# Altium footprint library Power_Lib_Altium.PcbLib: 383 footprints (part 22 of 24)
Each footprint in its own frame and in the unit in brackets; x right, y up, seen from the top. Pads: shape width x height; smd on the part's side, far side on the other; paste and mask are expansions set on the pad; w line width, h text height; cw(c..) or ccw(c..) is an arc to the next point about the centre after c.
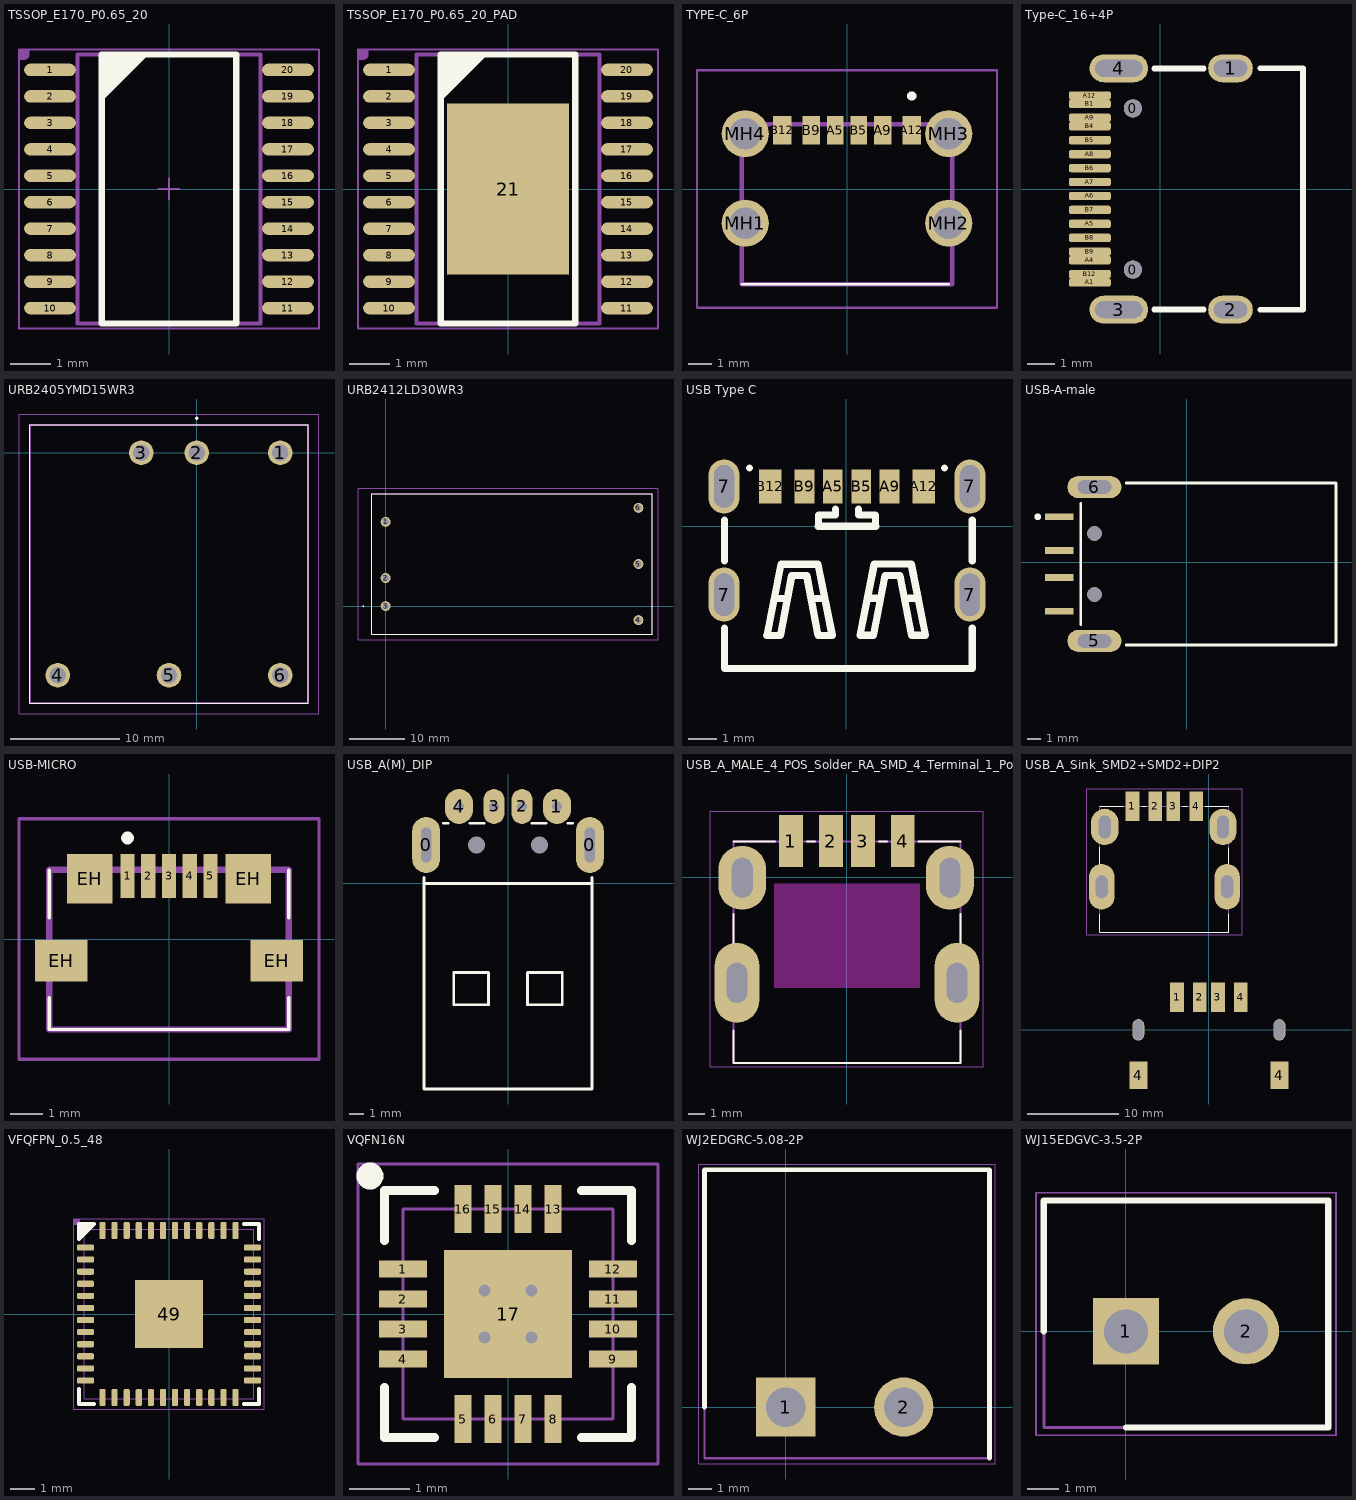
[diagram p21: the footprints below, top view; thin cyan lines are the x and y axes]

## TSSOP_E170_P0.65_20 [mil]
height 47.24
pads (20):
  oval 50x12 smd: 1(-115,115.16) 2(-115,89.57) 3(-115,63.98) 4(-115,38.39) 5(-115,12.8) 6(-115,-12.8) 7(-115,-38.39) 8(-115,-63.98) 9(-115,-89.57) 10(-115,-115.16) 11(115,-115.16) 12(115,-89.57) 13(115,-63.98) 14(115,-38.39) 15(115,-12.8) 16(115,12.8) 17(115,38.39) 18(115,63.98) 19(115,89.57) 20(115,115.16)
Top Overlay:
  region: -65,130 -20,130 -65,85
  lines w6: -65,-130 -65,130 65,130 65,-130 -65,-130
Mechanical 13:
  lines w2: -10,0 10,0 ; 0,-10 0,10
  lines w3.94: -88.58,-129.92 -88.58,129.92 88.58,129.92 88.58,-129.92 -88.58,-129.92
Mechanical 14:
  region: -145,135 -135,135 -135,130 -135,129.01 -135.76,127.17 -137.17,125.76 -139.01,125 -140,125 -145,125
  lines w2: -145,-135 145,-135 145,135 -145,135 -145,-135
3D body "User Library-TSSOP-20 6_6x4_4.STEP": height 41.69, standoff -1.62, extent -125.98,-129.91 125.99,129.93

## TSSOP_E170_P0.65_20_PAD [mil]
height 47.24
pads (21):
  oval 50x12 smd: 1(-115,115.16) 2(-115,89.57) 3(-115,63.98) 4(-115,38.39) 5(-115,12.8) 6(-115,-12.8) 7(-115,-38.39) 8(-115,-63.98) 9(-115,-89.57) 10(-115,-115.16) 11(115,-115.16) 12(115,-89.57) 13(115,-63.98) 14(115,-38.39) 15(115,-12.8) 16(115,12.8) 17(115,38.39) 18(115,63.98) 19(115,89.57) 20(115,115.16)
  rect 118.11x165.35 smd: 21(0,0)
Top Overlay:
  region: -65,130 -20,130 -65,85
  lines w6: -65,-130 -65,130 65,130 65,-130 -65,-130
Mechanical 13:
  lines w2: -10,0 10,0 ; 0,-10 0,10
  lines w3.94: -88.58,-129.92 -88.58,129.92 88.58,129.92 88.58,-129.92 -88.58,-129.92
Mechanical 14:
  region: -145,135 -135,135 -135,130 -135,129.01 -135.76,127.17 -137.17,125.76 -139.01,125 -140,125 -145,125
  lines w2: -145,-135 145,-135 145,135 -145,135 -145,-135
3D body "User Library-TSSOP-20 6_6x4_4.STEP": height 41.69, standoff -1.62, extent -125.98,-129.91 125.99,129.93

## TYPE-C_6P [mm]
pads (10):
  rect 0.7x1.2 smd: A5(-0.5,2.5) B5(0.5,2.5)
  rect 0.76x1.2 smd: A9(1.52,2.5) B9(-1.52,2.5)
  rect 0.8x1.2 smd: A12(2.75,2.5) B12(-2.75,2.5)
  round 2 hole 1.346: MH1(-4.32,-1.45) MH2(4.32,-1.45) MH3(4.32,2.35) MH4(-4.32,2.35)
Top Overlay:
  lines w0.1: -4.47,-4.05 4.32,-4.05
  lines w0.2: 2.75,3.85 cw(c2.75,3.95) 2.75,4.05 cw(c2.75,3.95) 2.75,3.85
Mechanical 13:
  lines w0.2: -4.47,-4.05 -4.47,2.75 4.47,2.75 4.47,-4.05 -4.47,-4.05
Mechanical 15:
  lines w0.1: -6.37,-5.05 -6.37,5.05 6.37,5.05 6.37,-5.05 -6.37,-5.05
3D body "TYPE-C-31-M-17.stp": height 3.26, standoff -0.94, extent -4.47,-4.31 4.48,3.09

## Type-C_16+4P [mm]
height 4.3
pads (22):
  round 0.65 hole 0.65: 0(-0.98,-2.89) 0(-0.98,2.89)
  oval 1.6x1 hole 0.6 slot 1.2 at 0 deg: 1(2.52,4.325) 2(2.52,-4.325)
  oval 2.1x1 hole 0.6 slot 1.7 at 0 deg: 3(-1.48,-4.325) 4(-1.48,4.325)
  rrect50% 1.5x0.3 smd: A1(-2.52,-3.35) A4(-2.52,-2.55) A5(-2.52,-1.25) A6(-2.52,-0.25) A7(-2.52,0.25) A8(-2.52,1.25) A9(-2.52,2.55) A12(-2.52,3.35) B1(-2.52,3.05) B4(-2.52,2.25) B5(-2.52,1.75) B6(-2.52,0.75) B7(-2.52,-0.75) B8(-2.52,-1.75) B9(-2.52,-2.25) B12(-2.52,-3.05)
Top Overlay:
  lines w0.203: -0.218,-4.318 1.56,-4.318 ; -0.218,4.318 1.56,4.318 ; 3.592,-4.325 5.12,-4.325 5.12,4.325 3.592,4.325
3D body "1.step": height 3.26, standoff -1, extent -2.568,-4.475 5.182,4.475

## URB2405YMD15WR3 [mm]
pads (6):
  round 2.25 hole 1.5: 1(7.62,0) 2(0,0) 3(-5.08,0) 4(-12.7,-20.32) 5(-2.54,-20.32) 6(7.62,-20.32)
Top Overlay:
  lines w0.1: -15.24,-22.86 10.16,-22.86 10.16,2.54 -15.24,2.54 -15.24,-22.86
  lines w0.2: 0,3.1 ccw(c0,3.15) 0,3.2 ; 0,3.1 cw(c0,3.15) 0,3.2 ; 0,3.1 ccw(c0,3.15) 0,3.2
Mechanical 13:
  lines w0.2: -15.24,-22.86 10.16,-22.86 10.16,2.54 -15.24,2.54 -15.24,-22.86
Mechanical 15:
  lines w0.1: -16.24,-23.86 11.16,-23.86 11.16,3.54 -16.24,3.54 -16.24,-23.86
3D body: height 0, standoff -5, extent -3.155,-20.939 -1.92,-19.701
3D body "URB2405YMD-10WR3.stp": height 12.3, standoff -5, extent -15.24,-22.86 10.16,2.54

## URB2412LD30WR3 [mm]
pads (6):
  round 1.8 hole 1.2: 1(0,15.24) 2(0,5.08) 3(0,0) 4(45.72,-2.54) 5(45.72,7.62) 6(45.72,17.78)
Top Overlay:
  lines w0.1: -2.54,-5.08 -2.54,20.32 48.26,20.32 48.26,-5.08 -2.54,-5.08
  lines w0.2: -4.1,0 cw(c-4.05,0) -4,0 ; -4.1,0 ccw(c-4.05,0) -4,0 ; -4.1,0 cw(c-4.05,0) -4,0
Mechanical 13:
  lines w0.2: -2.54,-5.08 -2.54,20.32 48.26,20.32 48.26,-5.08 -2.54,-5.08
Mechanical 15:
  lines w0.1: -5,-6.08 -5,21.32 49.26,21.32 49.26,-6.08 -5,-6.08
3D body "URB2412LD-30WHR3.stp": height 16.9, standoff -5, extent -2.54,-5.08 48.26,20.32

## USB Type C [mm]
pads (10):
  oval 1.1x1.9 hole 0.7 slot 1.5 at 90 deg: 7(-4.289,-2.405) 7(-4.289,1.395) 7(4.351,-2.405) 7(4.351,1.395)
  rect 0.7x1.2 smd: A5(-0.469,1.395) A9(1.531,1.395) B5(0.531,1.395) B9(-1.469,1.395)
  rect 0.8x1.2 smd: A12(2.731,1.395) B12(-2.669,1.395)
Top Overlay:
  lines w0.25: -4.269,-3.584 -4.269,-5.005 4.431,-5.005 4.431,-3.58 ; -4.269,-1.226 -4.269,0.216 ; -3.394,2.045 -3.393,2.045 ; -0.979,-0.005 1.041,-0.005 ; -0.969,-0.005 -0.969,0.395 -0.369,0.395 -0.369,0.595 ; 0.431,0.595 0.431,0.395 1.031,0.395 1.031,-0.005 ; 3.455,2.045 3.456,2.045 ; 4.431,-1.23 4.431,0.22
  lines w0.254: -2.487,-2.538 -2.088,-2.538 ; -1.188,-2.538 -0.788,-2.538 ; 0.79,-2.533 1.189,-2.533 ; 2.089,-2.533 2.489,-2.533 ; -2.787,-3.839 -2.289,-1.337 -0.988,-1.337 -0.488,-3.839 -0.983,-3.839 -1.382,-1.738 -1.91,-1.738 -2.312,-3.839 -2.787,-3.839 ; 0.49,-3.833 0.988,-1.332 2.288,-1.332 2.789,-3.833 2.294,-3.833 1.895,-1.733 1.366,-1.733 0.965,-3.833 0.49,-3.833
Mechanical 5:
  region: -2.944,1.895 -2.394,1.895 -2.394,0.895 -2.944,0.895
  region: -1.744,1.895 -1.194,1.895 -1.194,0.895 -1.744,0.895
  region: -0.744,1.895 -0.194,1.895 -0.194,0.895 -0.744,0.895
  region: 0.256,1.895 0.806,1.895 0.806,0.895 0.256,0.895
  region: 1.256,1.895 1.806,1.895 1.806,0.895 1.256,0.895
  region: 2.456,1.895 3.006,1.895 3.006,0.895 2.456,0.895
  region: 4.151,1.795 4.551,1.795 4.551,0.995 4.151,0.995
  region: -4.489,1.795 -4.089,1.795 -4.089,0.995 -4.489,0.995
  region: -4.489,-2.005 -4.089,-2.005 -4.089,-2.805 -4.489,-2.805
  region: 4.151,-2.005 4.551,-2.005 4.551,-2.805 4.151,-2.805
Mechanical 15:
  lines w0.003: 0.633,-3.059 0.683,-3.009

## USB-A-male [mm]
pads (8):
  rect 2.1x0.5 smd: 1(-9.453,3.354) 2(-9.453,0.854) 3(-9.453,-1.146) 4(-9.453,-3.646)
  oval 4x1.65 hole 1 slot 2.5 at 0 deg: 5(-6.853,-5.846) 6(-6.853,5.554)
  round 0.8 hole 1.1 unplated: MH1(-6.853,-2.396) MH2(-6.853,2.104)
Top Overlay:
  circle w0.25: c-11.053,3.354 r0.125
  lines w0.2: -7.853,-4.621 -7.853,4.329 ; -4.483,-6.146 11.047,-6.146 11.047,5.854 -4.483,5.854
3D body "User Library-USB-Male Port.SLDPRT": height 1.75, standoff -3.01, extent -7.772,-6.156 10.56,5.852

## USB-MICRO [mm]
pads (9):
  rect 0.45x1.38 smd: 1(-1.3,1.975) 2(-0.65,1.975) 3(0,1.975) 4(0.65,1.975) 5(1.3,1.975)
  rect 1.65x1.3 smd: EH(-3.375,-0.685) EH(3.375,-0.685)
  rect 1.425x1.55 smd: EH(-2.487,1.89) EH(2.487,1.89)
Top Overlay:
  lines w0.1: -3.75,-1.835 -3.75,-2.835 3.75,-2.835 3.75,-1.835 ; -3.75,0.665 -3.75,2.165 ; 3.75,0.665 3.75,2.165
  lines w0.2: -1.4,3.165 cw(c-1.3,3.165) -1.2,3.165 cw(c-1.3,3.165) -1.4,3.165
Mechanical 13:
  lines w0.2: -3.75,-2.835 -3.75,2.165 3.75,2.165 3.75,-2.835 -3.75,-2.835
Mechanical 15:
  lines w0.1: -4.7,-3.765 -4.7,3.765 4.7,3.765 4.7,-3.765 -4.7,-3.765
3D body "0473461001.stp": height 2.72, standoff 0.01, extent -3.9,-2.5 3.9,2.5

## USB_A(M)_DIP [mm]
pads (8):
  oval 2x4 hole 0.7 slot 2.5 at 90 deg: 0(-5.85,2.75) 0(5.85,2.75)
  round 0.2 hole 1.2: 0(-2.25,2.75) 0(2.25,2.75)
  oval 2x2.5 hole 0.7: 1(3.5,5.5) 4(-3.5,5.5)
  oval 1.5x2.5 hole 0.7: 2(1,5.5) 3(-1,5.5)
Top Overlay:
  lines w0.2: -6,0 6,0 ; -6,0.425 -6,-14.7 6,-14.7 6,0.425 ; -4.625,4.3 -4.275,4.3 ; -2.725,4.3 -1.7,4.3 ; 1.7,4.3 2.725,4.3 ; 4.275,4.3 4.625,4.3 ; -3.875,-8.675 -3.875,-6.375 -1.4,-6.375 -1.4,-8.675 -3.875,-8.675 ; 1.4,-8.675 1.4,-6.375 3.875,-6.375 3.875,-8.675 1.4,-8.675
3D body "usb_a-usb_a-lp-c.stp": height 4.5, standoff -1.3, extent -6.303,-14.5 6.303,5.425

## USB_A_MALE_4_POS_Solder_RA_SMD_4_Terminal_1_Port [mm] "能过5A大电流：https://item.taobao.com/item.htm?spm=a1z0d.6639537.1997196601.4.56bb7484TiP584&id=575662474806"
pads (8):
  rect 1.5x3.25 smd: 1(-3.5,2.27) 2(-1,2.27) 3(1,2.27) 4(3.5,2.27)
  oval 2.8x5 hole 1.3 slot 2.5 at 90 deg: ""(-6.883,-6.604) ""(6.9,-6.604)
  oval 3x4 hole 1.3 slot 2.5 at 90 deg: ""(-6.55,-0.025) ""(6.45,-0.025)
Top Overlay:
  lines w0.127: -7.1,-9.6 -7.1,-11.61 7.1,-11.61 7.1,-9.59 ; -7.1,-4.24 -7.1,-2.28 ; -7.1,2.24 -4.5,2.24 ; -2.5,2.24 -2,2.24 ; 2,2.24 2.52,2.24 ; 4.48,2.24 7.1,2.24 ; 7.1,-4.22 7.1,-2.29
Keep-Out Layer:
  region: 4.55,-6.914 -4.553,-6.914 -4.553,-0.41 4.55,-0.41
Mechanical 13:
  circle w0.2: c-3.503,1.609 r0.25
  lines w0.127: -7.1,-11.61 7.1,-11.61 7.1,2.24 -7.1,2.24 ; -7.099,-11.61 -7.099,2.24
Mechanical 15:
  lines w0.05: -8.55,-11.86 -8.55,4.145 8.55,4.145 8.55,-11.86 -8.55,-11.86
3D body "c-1932638-3-e-3d.stp": height 7.63, standoff -1.23, extent -7.317,-11.684 7.314,3.256

## USB_A_Sink_SMD2+SMD2+DIP2 [mm]
pads (16):
  rect 1.5x3.25 smd: 1(-8.398,24.594) 1(-3.5,3.6) 2(-5.898,24.594) 2(-1,3.6) 3(-3.898,24.594) 3(1,3.6) 4(-1.398,24.594) 4(3.5,3.6)
  rect 2x3 smd: 4(-7.75,-5) 4(7.75,-5)
  oval 2.8x5 hole 1.3 slot 2.5 at 90 deg: ""(-11.782,15.72) ""(2.002,15.72)
  oval 3x4 hole 1.3 slot 2.5 at 90 deg: ""(-11.448,22.298) ""(1.552,22.298)
  oval 1.3x2.35 hole 1.1 slot 2.15 at 90 deg: ""(-7.75,0) ""(7.75,0)
Top Overlay:
  lines w0.127: -11.998,12.724 -11.998,10.714 2.202,10.714 2.202,12.734 ; -11.998,18.084 -11.998,20.044 ; -11.998,24.564 -9.398,24.564 ; -7.398,24.564 -6.898,24.564 ; -2.898,24.564 -2.378,24.564 ; -0.418,24.564 2.202,24.564 ; 2.202,18.104 2.202,20.034
Mechanical 13:
  circle w0.2: c-8.402,23.933 r0.25
  lines w0.127: -11.998,10.714 2.202,10.714 2.202,24.564 -11.998,24.564 ; -11.997,10.714 -11.997,24.564
Mechanical 15:
  lines w0.05: -13.448,10.464 -13.448,26.469 3.652,26.469 3.652,10.464 -13.448,10.464
3D body "48258-0001.stp": height 3.27, standoff -3.63, extent 6.552,11.224 23.652,25.224

## VFQFPN_0.5_48 [mil]
height 21.65
pads (49):
  rrect50% 28x10 smd: 1(-136,108.27) 2(-136,88.58) 3(-136,68.9) 4(-136,49.21) 5(-136,29.53) 6(-136,9.84) 7(-136,-9.84) 8(-136,-29.53) 9(-136,-49.21) 10(-136,-68.9) 11(-136,-88.58) 12(-136,-108.27) 25(136,-108.27) 26(136,-88.58) 27(136,-68.9) 28(136,-49.21) 29(136,-29.53) 30(136,-9.84) 31(136,9.84) 32(136,29.53) 33(136,49.21) 34(136,68.9) 35(136,88.58) 36(136,108.27)
  rrect50% 10x28 smd: 13(-108.27,-136) 14(-88.58,-136) 15(-68.9,-136) 16(-49.21,-136) 17(-29.53,-136) 18(-9.84,-136) 19(9.84,-136) 20(29.53,-136) 21(49.21,-136) 22(68.9,-136) 23(88.58,-136) 24(108.27,-136) 37(108.27,136) 38(88.58,136) 39(68.9,136) 40(49.21,136) 41(29.53,136) 42(9.84,136) 43(-9.84,136) 44(-29.53,136) 45(-49.21,136) 46(-68.9,136) 47(-88.58,136) 48(-108.27,136)
  rect 110.24x110.24 smd: 49(0,0)
Top Overlay:
  region: -146.67,146.67 -122,146.67 -146.67,122
  lines w6: -146.67,-122 -146.67,-146.67 -122,-146.67 ; 122,-146.67 146.67,-146.67 146.67,-122 ; 122,146.67 146.67,146.67 146.67,122 ; -146.67,122 -122,146.67 -146.67,146.67 -146.67,122
Top Solder:
  rectangle: -150,-108.27 -122,108.27
  region: 108.27,-150 108.27,-122 -108.27,-122 -108.27,-150
  region: 150,108.27 122,108.27 122,-108.27 150,-108.27
  region: -108.27,150 -108.27,122 108.27,122 108.27,150
Mechanical 13:
  lines w2: -10,0 10,0 ; 0,-10 0,10 ; -137.79,-137.8 -137.79,137.8 137.8,137.8 137.8,-137.8 -137.79,-137.8
Mechanical 14:
  region: -155,155 -145,155 -145,150 -145,149.01 -145.76,147.17 -147.17,145.76 -149.01,145 -150,145 -155,145
  lines w2: -155,-155 155,-155 155,155 -155,155 -155,-155
3D body "QFN50P700X700X55-48L.step": height 21.65, standoff 0, extent -138.58,-138.58 138.58,138.59

## VQFN16N [mm]
pads (17):
  rect 0.8x0.28 smd: 1(-1.75,0.75) 2(-1.75,0.25) 3(-1.75,-0.25) 4(-1.75,-0.75) 9(1.75,-0.75) 10(1.75,-0.25) 11(1.75,0.25) 12(1.75,0.75)
  rect 0.28x0.8 smd: 5(-0.75,-1.75) 6(-0.25,-1.75) 7(0.25,-1.75) 8(0.75,-1.75) 13(0.75,1.75) 14(0.25,1.75) 15(-0.25,1.75) 16(-0.75,1.75)
  rect 2.14x2.14 smd: 17(0,0)
via 0.394,0.394 diameter 0.5 hole 0.2
via -0.394,0.394 diameter 0.5 hole 0.2
via -0.394,-0.394 diameter 0.5 hole 0.2
via 0.394,-0.394 diameter 0.5 hole 0.2
Top Overlay:
  circle w0.25: c-2.3,2.3 r0.1
  lines w0.152: -2.057,-1.223 -2.057,-2.057 -1.223,-2.057 ; -2.057,1.223 -2.057,2.057 -1.223,2.057 ; 1.223,-2.057 2.057,-2.057 2.057,-1.223 ; 1.223,2.057 2.057,2.057 2.057,1.223
Mechanical 13:
  lines w0.051: -0.127,0 0.127,0 ; 0,-0.127 0,0.127 ; -1.75,-1.75 -1.75,1.75 1.75,1.75 1.75,-1.75 -1.75,-1.75
Mechanical 14:
  lines w0.051: -2.5,-2.5 -2.5,2.5 2.5,2.5 2.5,-2.5 -2.5,-2.5
3D body "RVA0016A.stp": height 1, standoff 0, extent -1.75,-1.75 1.75,1.75

## WJ2EDGRC-5.08-2P [mm]
pads (2):
  rect 2.55x2.55 hole 1.7: 1(0,0)
  round 2.55 hole 1.7: 2(5.08,0)
Top Overlay:
  lines w0.2: -3.49,0 -3.49,10.2 8.77,10.2 8.77,-2.2
Mechanical 13:
  lines w0.1: -3.49,-2.2 8.77,-2.2 8.77,10.2 -3.49,10.2 -3.49,-2.2
Mechanical 15:
  lines w0.05: -3.74,-2.45 -3.74,10.45 9.02,10.45 9.02,-2.45 -3.74,-2.45
3D body "WJ2EDGRC-5.08-2P.stp": height 8.3, standoff -4, extent -3.49,-2.2 8.57,10

## WJ15EDGVC-3.5-2P [mm]
pads (2):
  rect 2.1x2.1 hole 1.4: 1(0,0)
  round 2.1 hole 1.4: 2(3.81,0)
Top Overlay:
  lines w0.2: -2.605,0 -2.605,4.15 6.415,4.15 6.415,-3.05 0,-3.05
Mechanical 13:
  lines w0.1: -2.605,-3.05 -2.605,4.15 6.415,4.15 6.415,-3.05 -2.605,-3.05
Mechanical 15:
  lines w0.05: -2.855,-3.3 -2.855,4.4 6.665,4.4 6.665,-3.3 -2.855,-3.3
3D body "WJ15EDGVC-3.5-2P.stp": height 9.35, standoff -3.7, extent -2.455,-3.5 6.265,3.5